# Altium footprint library Intelliclone.PcbLib: 372 footprints (part 12 of 24)
Each footprint in its own frame and in the unit in brackets; x right, y up, seen from the top. Pads: shape width x height; smd on the part's side, far side on the other; paste and mask are expansions set on the pad; w line width, h text height; cw(c..) or ccw(c..) is an arc to the next point about the centre after c.
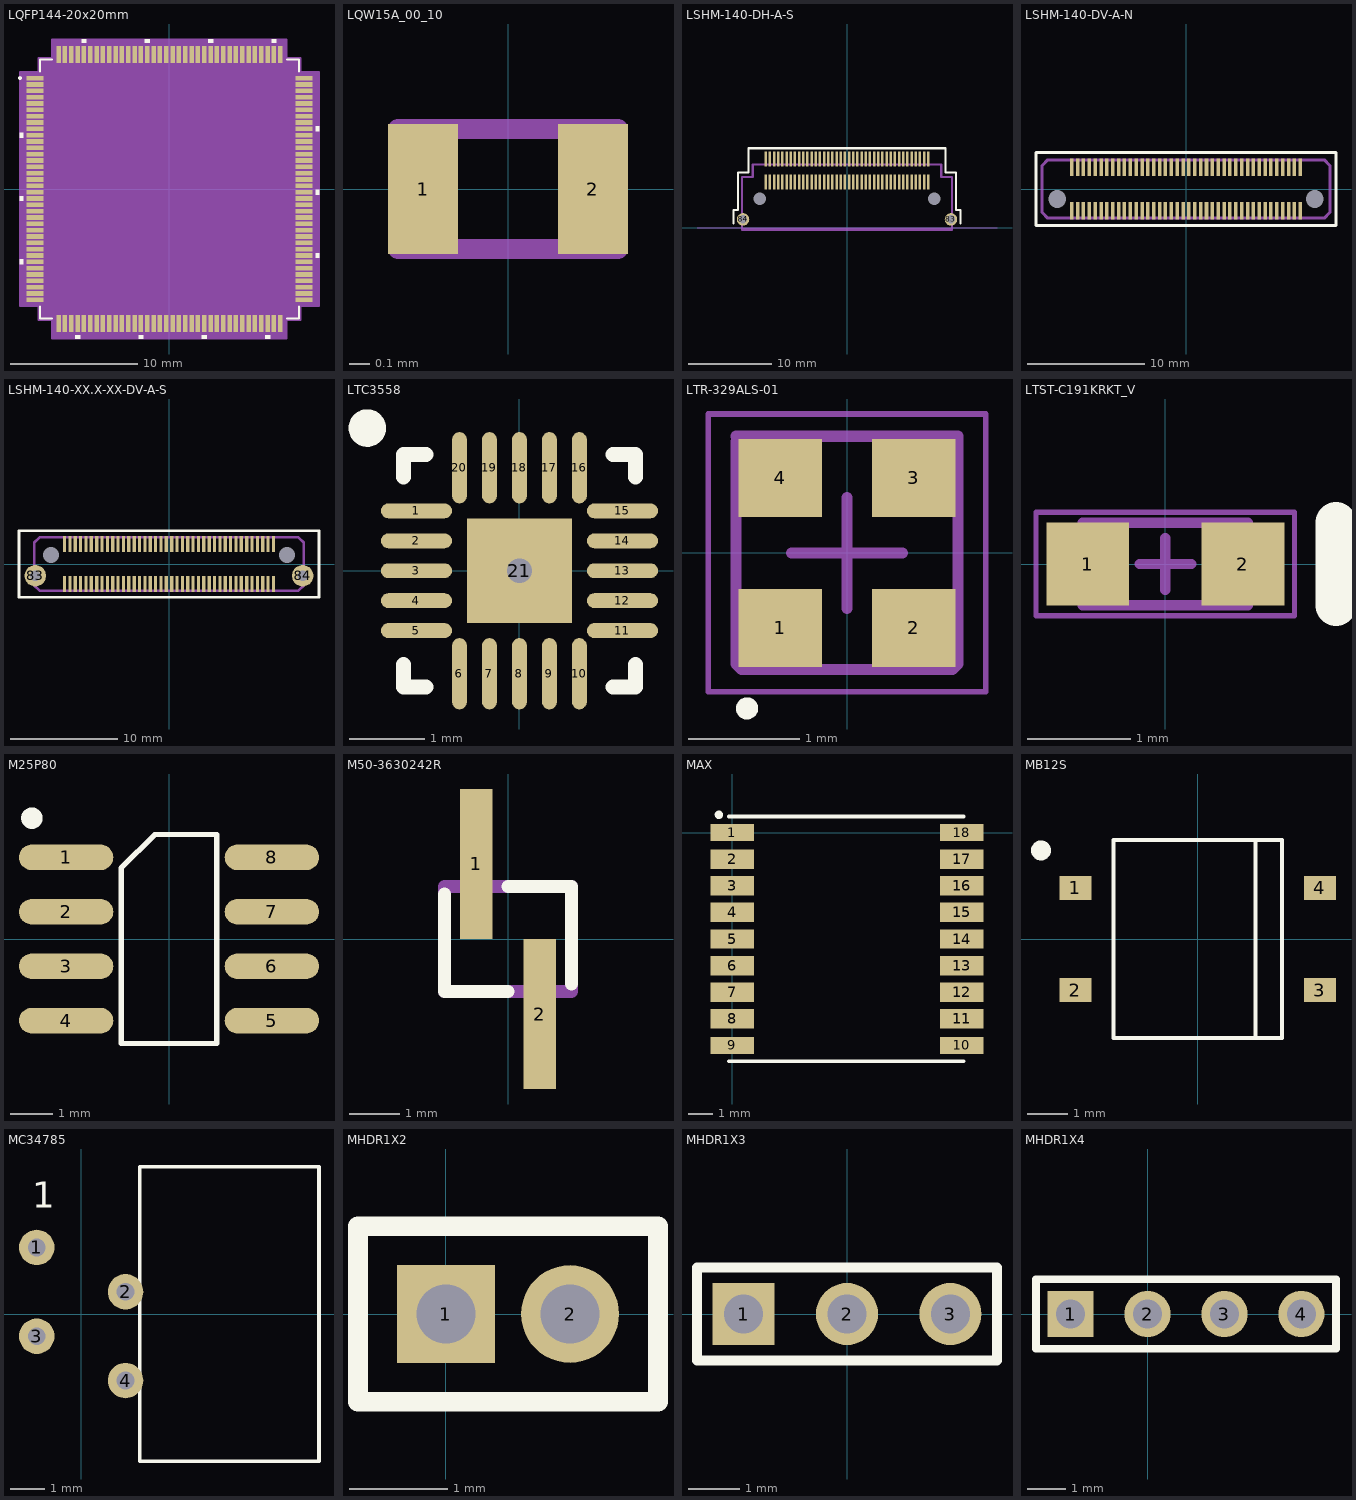
[diagram p11: the footprints below, top view; thin cyan lines are the x and y axes]

## LQFP144-20x20mm [mm]
pads (144):
  rect 1.346x0.356 smd: 1(-10.625,8.75) 2(-10.625,8.25) 3(-10.625,7.75) 4(-10.625,7.25) 5(-10.625,6.75) 6(-10.625,6.25) 7(-10.625,5.75) 8(-10.625,5.25) 9(-10.625,4.75) 10(-10.625,4.25) 11(-10.625,3.75) 12(-10.625,3.25) 13(-10.625,2.75) 14(-10.625,2.25) 15(-10.625,1.75) 16(-10.625,1.25) 17(-10.625,0.75) 18(-10.625,0.25) 19(-10.625,-0.25) 20(-10.625,-0.75) 21(-10.625,-1.25) 22(-10.625,-1.75) 23(-10.625,-2.25) 24(-10.625,-2.75) 25(-10.625,-3.25) 26(-10.625,-3.75) 27(-10.625,-4.25) 28(-10.625,-4.75) 29(-10.625,-5.25) 30(-10.625,-5.75) 31(-10.625,-6.25) 32(-10.625,-6.75) 33(-10.625,-7.25) 34(-10.625,-7.75) 35(-10.625,-8.25) 36(-10.625,-8.75) 73(10.625,-8.75) 74(10.625,-8.25) 75(10.625,-7.75) 76(10.625,-7.25) 77(10.625,-6.75) 78(10.625,-6.25) 79(10.625,-5.75) 80(10.625,-5.25) 81(10.625,-4.75) 82(10.625,-4.25) 83(10.625,-3.75) 84(10.625,-3.25) 85(10.625,-2.75) 86(10.625,-2.25) 87(10.625,-1.75) 88(10.625,-1.25) 89(10.625,-0.75) 90(10.625,-0.25) 91(10.625,0.25) 92(10.625,0.75) 93(10.625,1.25) 94(10.625,1.75) 95(10.625,2.25) 96(10.625,2.75) 97(10.625,3.25) 98(10.625,3.75) 99(10.625,4.25) 100(10.625,4.75) 101(10.625,5.25) 102(10.625,5.75) 103(10.625,6.25) 104(10.625,6.75) 105(10.625,7.25) 106(10.625,7.75) 107(10.625,8.25) 108(10.625,8.75)
  rect 0.356x1.346 smd: 37(-8.75,-10.625) 38(-8.25,-10.625) 39(-7.75,-10.625) 40(-7.25,-10.625) 41(-6.75,-10.625) 42(-6.25,-10.625) 43(-5.75,-10.625) 44(-5.25,-10.625) 45(-4.75,-10.625) 46(-4.25,-10.625) 47(-3.75,-10.625) 48(-3.25,-10.625) 49(-2.75,-10.625) 50(-2.25,-10.625) 51(-1.75,-10.625) 52(-1.25,-10.625) 53(-0.75,-10.625) 54(-0.25,-10.625) 55(0.25,-10.625) 56(0.75,-10.625) 57(1.25,-10.625) 58(1.75,-10.625) 59(2.25,-10.625) 60(2.75,-10.625) 61(3.25,-10.625) 62(3.75,-10.625) 63(4.25,-10.625) 64(4.75,-10.625) 65(5.25,-10.625) 66(5.75,-10.625) 67(6.25,-10.625) 68(6.75,-10.625) 69(7.25,-10.625) 70(7.75,-10.625) 71(8.25,-10.625) 72(8.75,-10.625) 109(8.75,10.625) 110(8.25,10.625) 111(7.75,10.625) 112(7.25,10.625) 113(6.75,10.625) 114(6.25,10.625) 115(5.75,10.625) 116(5.25,10.625) 117(4.75,10.625) 118(4.25,10.625) 119(3.75,10.625) 120(3.25,10.625) 121(2.75,10.625) 122(2.25,10.625) 123(1.75,10.625) 124(1.25,10.625) 125(0.75,10.625) 126(0.25,10.625) 127(-0.25,10.625) 128(-0.75,10.625) 129(-1.25,10.625) 130(-1.75,10.625) 131(-2.25,10.625) 132(-2.75,10.625) 133(-3.25,10.625) 134(-3.75,10.625) 135(-4.25,10.625) 136(-4.75,10.625) 137(-5.25,10.625) 138(-5.75,10.625) 139(-6.25,10.625) 140(-6.75,10.625) 141(-7.25,10.625) 142(-7.75,10.625) 143(-8.25,10.625) 144(-8.75,10.625)
Top Overlay:
  circle w0.152: c-11.802,8.75 r0.076
  region: -11.552,4.44 -11.806,4.44 -11.806,4.059 -11.552,4.059
  region: -11.552,-0.56 -11.806,-0.56 -11.806,-0.941 -11.552,-0.941
  region: -11.552,-5.56 -11.806,-5.56 -11.806,-5.941 -11.552,-5.941
  region: -7.06,-11.552 -7.441,-11.552 -7.441,-11.806 -7.06,-11.806
  region: -2.06,-11.552 -2.441,-11.552 -2.441,-11.806 -2.06,-11.806
  region: 2.94,-11.552 2.559,-11.552 2.559,-11.806 2.94,-11.806
  region: 7.94,-11.552 7.559,-11.552 7.559,-11.806 7.94,-11.806
  region: 11.552,-5.059 11.806,-5.059 11.806,-5.44 11.552,-5.44
  region: 11.552,-0.059 11.806,-0.059 11.806,-0.44 11.552,-0.44
  region: 11.552,4.941 11.806,4.941 11.806,4.56 11.552,4.56
  region: 8.441,11.552 8.06,11.552 8.06,11.806 8.441,11.806
  region: 3.441,11.552 3.06,11.552 3.06,11.806 3.441,11.806
  region: -1.559,11.552 -1.94,11.552 -1.94,11.806 -1.559,11.806
  region: -6.559,11.552 -6.94,11.552 -6.94,11.806 -6.559,11.806
  lines w0.152: -10.223,-9.261 -10.223,-10.223 -9.261,-10.223 ; -10.223,9.261 -10.223,10.223 -9.261,10.223 ; 9.261,-10.223 10.223,-10.223 10.223,-9.261 ; 9.261,10.223 10.223,10.223 10.223,9.261
Mechanical 13:
  circle w0: c-9.317,8.75 r0.076
  lines w0.025: -10.096,8.826 -8.826,10.096 ; -10.096,-10.096 10.096,-10.096 10.096,10.096 -10.096,10.096 -10.096,-10.096
Mechanical 15:
  region: -9.258,-10.351 -10.351,-10.351 -10.351,-9.258 -11.806,-9.258 -11.806,9.258 -10.351,9.258 -10.351,10.351 -9.258,10.351 -9.258,11.806 9.258,11.806 9.258,10.351 10.351,10.351 10.351,9.258 11.806,9.258 11.806,-9.258 10.351,-9.258 10.351,-10.351 9.258,-10.351 9.258,-11.806 -9.258,-11.806
  lines w0.152: -11.806,-9.258 -10.351,-9.258 -10.351,-10.351 -9.258,-10.351 -9.258,-11.806 9.258,-11.806 9.258,-10.351 10.351,-10.351 10.351,-9.258 11.806,-9.258 11.806,9.258 10.351,9.258 10.351,10.351 9.258,10.351 9.258,11.806 -9.258,11.806 -9.258,10.351 -10.351,10.351 -10.351,9.258 -11.806,9.258 -11.806,-9.258
3D body: height 0.25, standoff 0, extent 0,0 0.254,0.254
3D body: height 1.6, standoff 0, extent 0,0 0,0
3D body: height 1.6, standoff 0, extent 0,0 0,0
3D body "LQFP144-20x20mm.step": height 1.6, standoff 0, extent -10.948,-10.948 10.948,10.948

## LQW15A_00_10 [mm] "Murata"
height 0.6
pads (2):
  rect 0.35x0.65 smd: 1(-0.425,0) 2(0.425,0)
Mechanical 5:
  lines w0.1: -0.55,-0.3 -0.55,0.3 0.55,0.3 0.55,-0.3 -0.55,-0.3
  text ".Designator" at -0.457,0.508 h0.25
3D body: height 0.6, standoff 0.15, extent -0.249,-0.349 0.249,0.349
3D body: height 0.6, standoff 0, extent -0.55,-0.3 -0.25,0.3
3D body: height 0.6, standoff 0, extent 0.25,-0.3 0.55,0.3

## LSHM-140-DH-A-S [mm]
pads (84):
  rect 0.3x1.8 smd mask+0.05: 1(9.75,8.27) 2(9.75,5.52) 3(9.25,8.27) 4(9.25,5.52) 5(8.75,8.27) 6(8.75,5.52) 7(8.25,8.27) 8(8.25,5.52) 9(7.75,8.27) 10(7.75,5.52) 11(7.25,8.27) 12(7.25,5.52) 13(6.75,8.27) 14(6.75,5.52) 15(6.25,8.27) 16(6.25,5.52) 17(5.75,8.27) 18(5.75,5.52) 19(5.25,8.27) 20(5.25,5.52) 21(4.75,8.27) 22(4.75,5.52) 23(4.25,8.27) 24(4.25,5.52) 25(3.75,8.27) 26(3.75,5.52) 27(3.25,8.27) 28(3.25,5.52) 29(2.75,8.27) 30(2.75,5.52) 31(2.25,8.27) 32(2.25,5.52) 33(1.75,8.27) 34(1.75,5.52) 35(1.25,8.27) 36(1.25,5.52) 37(0.75,8.27) 38(0.75,5.52) 39(0.25,8.27) 40(0.25,5.52) 41(-0.25,8.27) 42(-0.25,5.52) 43(-0.75,8.27) 44(-0.75,5.52) 45(-1.25,8.27) 46(-1.25,5.52) 47(-1.75,8.27) 48(-1.75,5.52) 49(-2.25,8.27) 50(-2.25,5.52) 51(-2.75,8.27) 52(-2.75,5.52) 53(-3.25,8.27) 54(-3.25,5.52) 55(-3.75,8.27) 56(-3.75,5.52) 57(-4.25,8.27) 58(-4.25,5.52) 59(-4.75,8.27) 60(-4.75,5.52) 61(-5.25,8.27) 62(-5.25,5.52) 63(-5.75,8.27) 64(-5.75,5.52) 65(-6.25,8.27) 66(-6.25,5.52) 67(-6.75,8.27) 68(-6.75,5.52) 69(-7.25,8.27) 70(-7.25,5.52) 71(-7.75,8.27) 72(-7.75,5.52) 73(-8.25,8.27) 74(-8.25,5.52) 75(-8.75,8.27) 76(-8.75,5.52) 77(-9.25,8.27) 78(-9.25,5.52) 79(-9.75,8.27) 80(-9.75,5.52)
  round 0 hole 1.5 unplated: 81(10.5,3.47) 82(-10.5,3.47)
  round 1.5 hole 1 mask+0.075: 83(12.475,1.02) 84(-12.475,1.02)
Top Overlay:
  lines w0.25: -13.6,0.5 -13.6,2.15 -13.1,2.15 -13.1,6.62 -11.8,6.62 -11.8,9.55 11.8,9.55 11.8,6.62 13.1,6.62 13.1,2.15 13.6,2.15 13.6,0.5
Mechanical 1:
  lines w0.25: -12.6,-0.23 -12.6,6.12 -11.31,6.12 -11.31,7.62 11.31,7.62 11.31,6.12 12.6,6.12 12.6,-0.23 -12.6,-0.23
  text "J1" at -0.439,2.07 h0.75
Mechanical 21:
  lines w0.1: -18,0 18,0
3D body "LSHM-140-01-L-DH-A-S-K-TR.stp": height 5.32, standoff -1.15, extent -12.923,-0.169 12.923,8.781

## LSHM-140-DV-A-N [mm]
pads (82):
  rect 0.3x1.5 smd mask+0.05: 1(9.75,-1.85) 2(9.75,1.85) 3(9.25,-1.85) 4(9.25,1.85) 5(8.75,-1.85) 6(8.75,1.85) 7(8.25,-1.85) 8(8.25,1.85) 9(7.75,-1.85) 10(7.75,1.85) 11(7.25,-1.85) 12(7.25,1.85) 13(6.75,-1.85) 14(6.75,1.85) 15(6.25,-1.85) 16(6.25,1.85) 17(5.75,-1.85) 18(5.75,1.85) 19(5.25,-1.85) 20(5.25,1.85) 21(4.75,-1.85) 22(4.75,1.85) 23(4.25,-1.85) 24(4.25,1.85) 25(3.75,-1.85) 26(3.75,1.85) 27(3.25,-1.85) 28(3.25,1.85) 29(2.75,-1.85) 30(2.75,1.85) 31(2.25,-1.85) 32(2.25,1.85) 33(1.75,-1.85) 34(1.75,1.85) 35(1.25,-1.85) 36(1.25,1.85) 37(0.75,-1.85) 38(0.75,1.85) 39(0.25,-1.85) 40(0.25,1.85) 41(-0.25,-1.85) 42(-0.25,1.85) 43(-0.75,-1.85) 44(-0.75,1.85) 45(-1.25,-1.85) 46(-1.25,1.85) 47(-1.75,-1.85) 48(-1.75,1.85) 49(-2.25,-1.85) 50(-2.25,1.85) 51(-2.75,-1.85) 52(-2.75,1.85) 53(-3.25,-1.85) 54(-3.25,1.85) 55(-3.75,-1.85) 56(-3.75,1.85) 57(-4.25,-1.85) 58(-4.25,1.85) 59(-4.75,-1.85) 60(-4.75,1.85) 61(-5.25,-1.85) 62(-5.25,1.85) 63(-5.75,-1.85) 64(-5.75,1.85) 65(-6.25,-1.85) 66(-6.25,1.85) 67(-6.75,-1.85) 68(-6.75,1.85) 69(-7.25,-1.85) 70(-7.25,1.85) 71(-7.75,-1.85) 72(-7.75,1.85) 73(-8.25,-1.85) 74(-8.25,1.85) 75(-8.75,-1.85) 76(-8.75,1.85) 77(-9.25,-1.85) 78(-9.25,1.85) 79(-9.75,-1.85) 80(-9.75,1.85)
  round 0.5 hole 1.5 unplated mask+0.75: 81(11,-0.85) 82(-11,-0.85)
Top Overlay:
  lines w0.25: -12.8,-3.1 -12.8,3.1 12.8,3.1 12.8,-3.1 -12.8,-3.1
Mechanical 1:
  lines w0.25: -12.3,-1.99 -12.3,1.99 -11.8,2.49 11.8,2.49 12.3,1.99 12.3,-1.99 11.8,-2.49 -11.8,-2.49 -12.3,-1.99
  text "J1" at -0.439,-0.45 h0.75
3D body "LSHM-140-04.0-L-DV-A-S-K-TR.stp": height 5.45, standoff -1.8, extent -12.923,-2.49 12.923,2.49

## LSHM-140-XX.X-XX-DV-A-S [mm]
pads (84):
  rect 0.3x1.5 smd mask+0.05: 1(-9.75,1.85) 2(-9.75,-1.85) 3(-9.25,1.85) 4(-9.25,-1.85) 5(-8.75,1.85) 6(-8.75,-1.85) 7(-8.25,1.85) 8(-8.25,-1.85) 9(-7.75,1.85) 10(-7.75,-1.85) 11(-7.25,1.85) 12(-7.25,-1.85) 13(-6.75,1.85) 14(-6.75,-1.85) 15(-6.25,1.85) 16(-6.25,-1.85) 17(-5.75,1.85) 18(-5.75,-1.85) 19(-5.25,1.85) 20(-5.25,-1.85) 21(-4.75,1.85) 22(-4.75,-1.85) 23(-4.25,1.85) 24(-4.25,-1.85) 25(-3.75,1.85) 26(-3.75,-1.85) 27(-3.25,1.85) 28(-3.25,-1.85) 29(-2.75,1.85) 30(-2.75,-1.85) 31(-2.25,1.85) 32(-2.25,-1.85) 33(-1.75,1.85) 34(-1.75,-1.85) 35(-1.25,1.85) 36(-1.25,-1.85) 37(-0.75,1.85) 38(-0.75,-1.85) 39(-0.25,1.85) 40(-0.25,-1.85) 41(0.25,1.85) 42(0.25,-1.85) 43(0.75,1.85) 44(0.75,-1.85) 45(1.25,1.85) 46(1.25,-1.85) 47(1.75,1.85) 48(1.75,-1.85) 49(2.25,1.85) 50(2.25,-1.85) 51(2.75,1.85) 52(2.75,-1.85) 53(3.25,1.85) 54(3.25,-1.85) 55(3.75,1.85) 56(3.75,-1.85) 57(4.25,1.85) 58(4.25,-1.85) 59(4.75,1.85) 60(4.75,-1.85) 61(5.25,1.85) 62(5.25,-1.85) 63(5.75,1.85) 64(5.75,-1.85) 65(6.25,1.85) 66(6.25,-1.85) 67(6.75,1.85) 68(6.75,-1.85) 69(7.25,1.85) 70(7.25,-1.85) 71(7.75,1.85) 72(7.75,-1.85) 73(8.25,1.85) 74(8.25,-1.85) 75(8.75,1.85) 76(8.75,-1.85) 77(9.25,1.85) 78(9.25,-1.85) 79(9.75,1.85) 80(9.75,-1.85)
  round 0.5 hole 1.5 unplated mask+0.75: 81(-11,0.85) 82(11,0.85)
  round 2 hole 1 mask+0.075: 83(-12.475,-1.1) 84(12.475,-1.1)
Top Overlay:
  lines w0.25: -14,-3.1 14,-3.1 14,3.1 -14,3.1 -14,-3.1
Mechanical 1:
  lines w0.25: -12.575,-1.99 -12.075,-2.49 12.075,-2.49 12.575,-1.99 12.575,1.99 12.075,2.49 -12.075,2.49 -12.575,1.99 -12.575,-1.99
  text "J1" at -0.25,-0.25 h0.75
3D body "LSHM-140-04.0-L-DV-A-S-K-TR.stp": height 5.45, standoff -1.8, extent -12.923,-2.49 12.923,2.49

## LTC3558 [mm]
pads (21):
  oval 0.95x0.2 smd: 1(-1.375,0.8) 2(-1.375,0.4) 3(-1.375,0) 4(-1.375,-0.4) 5(-1.375,-0.8) 11(1.375,-0.8) 12(1.375,-0.4) 13(1.375,0) 14(1.375,0.4) 15(1.375,0.8)
  oval 0.2x0.95 smd: 6(-0.8,-1.375) 7(-0.4,-1.375) 8(0,-1.375) 9(0.4,-1.375) 10(0.8,-1.375) 16(0.8,1.375) 17(0.4,1.375) 18(0,1.375) 19(-0.4,1.375) 20(-0.8,1.375)
  rect 1.4x1.4 smd: 21(0,0)
via 0,0 diameter 0.66 hole 0.33
Top Overlay:
  circle w0.25: c-2.03,1.905 r0.125
  lines w0.2: -1.55,-1.25 -1.55,-1.55 -1.25,-1.55 ; -1.55,1.25 -1.55,1.55 -1.25,1.55 ; 1.25,-1.55 1.55,-1.55 1.55,-1.25 ; 1.25,1.55 1.55,1.55 1.55,1.25
3D body: height 0.8, standoff 0.05, extent -1.55,-1.55 1.55,1.55

## LTR-329ALS-01 [mm] "Optical Sensor"
height 0.7
pads (4):
  rect 0.75x0.7 smd: 1(-0.6,-0.675) 2(0.6,-0.675) 3(0.6,0.675) 4(-0.6,0.675)
Top Overlay:
  circle w0.1: c-0.9,-1.4 r0.05
Mechanical 13:
  lines w0.1: -1,1 -1,-1 -0.95,-1.05 0.95,-1.05 1,-1 1,1.05 -1,1.05
Mechanical 15:
  lines w0.05: -1.25,-1.25 -1.25,1.25 1.25,1.25 1.25,-1.25 -1.25,-1.25
  lines w0.1: -0.5,0 0.5,0 ; 0,-0.5 0,0.5
3D body "LTR-329ALS-simple.step": height 0.61, standoff 0, extent -1,-1 1,1

## LTST-C191KRKT_V [mm] "SMD, 2-Leads, Body 1.6x0.8mm"
height 0.9
pads (2):
  rect 0.8x0.8 smd: 1(-0.75,0) 2(0.75,0)
Top Overlay:
  lines w0.4: 1.65,-0.4 1.65,0.4
Mechanical 13:
  lines w0.1: -0.55,-0.4 -0.55,0.4 ; 0.55,-0.4 0.55,0.4 ; -0.8,-0.4 -0.8,0.4 0.8,0.4 0.8,-0.4 -0.8,-0.4
Mechanical 15:
  lines w0.05: -1.25,-0.5 1.25,-0.5 1.25,0.5 -1.25,0.5 -1.25,-0.5
  lines w0.1: -0.25,0 0.25,0 ; 0,-0.25 0,0.25
3D body: height 0.9, standoff 0.38, extent -0.55,-0.4 0.55,0.4
3D body: height 0.38, standoff 0, extent -0.8,-0.4 0.8,0.4

## M25P80 [mm]
height 2.54
pads (8):
  oval 2.2x0.6 smd: 1(-2.4,1.905) 2(-2.4,0.635) 3(-2.4,-0.635) 4(-2.4,-1.905) 5(2.4,-1.905) 6(2.4,-0.635) 7(2.4,0.635) 8(2.4,1.905)
Top Overlay:
  lines w0.127: -1.118,-2.438 -1.118,1.651 -0.33,2.438 1.118,2.438 1.118,-2.438 -1.118,-2.438
  lines w0.25: -3.075,2.836 ccw(c-3.198,2.819) -3.073,2.819
3D body: height 1.02, standoff 0.1, extent -1.956,-2.438 1.956,2.438

## M50-3630242R [mm]
pads (2):
  rect 0.65x3 smd: 1(-0.635,1.5) 2(0.635,-1.5)
Top Overlay:
  lines w0.254: -1.27,0.9 -1.27,-1.05 0,-1.05 ; 0,1.05 1.27,1.05 1.27,-0.9
Mechanical 15:
  lines w0.254: -1.27,-1.05 -1.27,1.05 1.27,1.05 1.27,-1.05 -1.27,-1.05
3D body "M50-3630242.STEP": height 4.47, standoff -0.03, extent -1.272,-2.373 1.27,2.627

## MAX [mm] "u-blox MAX GPS/GNSS module"
height 2.7
pads (18):
  rect 1.8x0.7 smd paste-0.1: 1(0,0) 9(0,-8.8) 10(9.5,-8.8) 18(9.5,0)
  rect 1.8x0.8 smd paste-0.1: 2(0,-1.1) 3(0,-2.2) 4(0,-3.3) 5(0,-4.4) 6(0,-5.5) 7(0,-6.6) 8(0,-7.7) 11(9.5,-7.7) 12(9.5,-6.6) 13(9.5,-5.5) 14(9.5,-4.4) 15(9.5,-3.3) 16(9.5,-2.2) 17(9.5,-1.1)
Top Overlay:
  lines w0.16: -0.127,-9.455 9.576,-9.455 ; -0.12,0.667 9.576,0.667
  lines w0.2: -0.619,0.74 cw(c-0.545,0.733) -0.616,0.712
Top Paste:
  region: -1.45,-7.3 -1.45,-8.1 -0.05,-8.1 -0.05,-8 0.85,-8 0.85,-7.4 -0.05,-7.4 -0.05,-7.3
  region: -1.45,-6.2 -1.45,-7 -0.05,-7 -0.05,-6.9 0.85,-6.9 0.85,-6.3 -0.05,-6.3 -0.05,-6.2
  region: -1.45,-5.1 -1.45,-5.9 -0.05,-5.9 -0.05,-5.8 0.85,-5.8 0.85,-5.2 -0.05,-5.2 -0.05,-5.1
  region: -1.45,-4 -1.45,-4.8 -0.05,-4.8 -0.05,-4.7 0.85,-4.7 0.85,-4.1 -0.05,-4.1 -0.05,-4
  region: -1.45,-2.9 -1.45,-3.7 -0.05,-3.7 -0.05,-3.6 0.85,-3.6 0.85,-3 -0.05,-3 -0.05,-2.9
  region: -1.45,-1.8 -1.45,-2.6 -0.05,-2.6 -0.05,-2.5 0.85,-2.5 0.85,-1.9 -0.05,-1.9 -0.05,-1.8
  region: -1.45,-0.7 -1.45,-1.5 -0.05,-1.5 -0.05,-1.4 0.85,-1.4 0.85,-0.8 -0.05,-0.8 -0.05,-0.7
  region: 10.95,-1.5 10.95,-0.7 9.55,-0.7 9.55,-0.8 8.65,-0.8 8.65,-1.4 9.55,-1.4 9.55,-1.5
  region: 10.95,-2.6 10.95,-1.8 9.55,-1.8 9.55,-1.9 8.65,-1.9 8.65,-2.5 9.55,-2.5 9.55,-2.6
  region: 10.95,-3.7 10.95,-2.9 9.55,-2.9 9.55,-3 8.65,-3 8.65,-3.6 9.55,-3.6 9.55,-3.7
  region: 10.95,-4.8 10.95,-4 9.55,-4 9.55,-4.1 8.65,-4.1 8.65,-4.7 9.55,-4.7 9.55,-4.8
  region: 10.95,-5.9 10.95,-5.1 9.55,-5.1 9.55,-5.2 8.65,-5.2 8.65,-5.8 9.55,-5.8 9.55,-5.9
  region: 10.95,-7 10.95,-6.2 9.55,-6.2 9.55,-6.3 8.65,-6.3 8.65,-6.9 9.55,-6.9 9.55,-7
  region: 10.95,-8.1 10.95,-7.3 9.55,-7.3 9.55,-7.4 8.65,-7.4 8.65,-8 9.55,-8 9.55,-8.1
  region: 10.95,-0.35 10.95,0.35 9.55,0.35 9.55,0.25 8.65,0.25 8.65,-0.25 9.55,-0.25 9.55,-0.35
  region: -1.45,0.35 -1.45,-0.35 -0.05,-0.35 -0.05,-0.25 0.85,-0.25 0.85,0.25 -0.05,0.25 -0.05,0.35
  region: -1.45,-8.45 -1.45,-9.15 -0.05,-9.15 -0.05,-9.05 0.85,-9.05 0.85,-8.55 -0.05,-8.55 -0.05,-8.45
  region: 10.95,-9.15 10.95,-8.45 9.55,-8.45 9.55,-8.55 8.65,-8.55 8.65,-9.05 9.55,-9.05 9.55,-9.15
3D body "MAX (STEP-AP214).STEP": height 2.47, standoff 0, extent -0.124,-9.45 9.576,0.65

## MB12S [mm]
pads (4):
  rect 0.8x0.6 smd: 1(-3.05,1.275) 2(-3.05,-1.275) 3(3.05,-1.275) 4(3.05,1.275)
Top Overlay:
  circle w0.25: c-3.91,2.21 r0.125
  lines w0.102: 1.44,-2.475 1.44,2.475 ; -2.1,-2.475 2.1,-2.475 2.1,2.475 -2.1,2.475 -2.1,-2.475
3D body: height 0.69, standoff 0.1, extent -3.226,-1.321 3.251,1.372

## MC34785 [mil] "1.25mm 4 pin FPC header"
height 209.84
pads (4):
  round 40 hole 20: 1(-50,75) 2(50,25) 3(-50,-25) 4(50,-75)
Top Overlay:
  lines w4.02: 66,-166 268,-166 268,166 66,166 66,-166
  text "1" at -55,110 h50
3D body: height 110, standoff 4, extent 66,-166 268,165

## MHDR1X2 [mm] "Connector; Header; 2 Position"
pads (2):
  rect 1x1 hole 0.6: 1(0,0)
  round 1 hole 0.6: 2(1.27,0)
Top Overlay:
  lines w0.2: -0.9,-0.9 2.17,-0.9 2.17,0.9 -0.9,0.9 -0.9,-0.9

## MHDR1X3 [mm] "Connector; Header; 3 Position 2mm"
pads (3):
  rect 1.2x1.2 hole 0.75: 1(-2,0)
  round 1.2 hole 0.75: 2(0,0) 3(2,0)
Top Overlay:
  lines w0.2: -2.9,-0.9 -2.9,0.9 2.9,0.9 2.9,-0.9 -2.9,-0.9

## MHDR1X4 [mm] "Connector; Header; 3 Position 2mm"
pads (4):
  rect 1.2x1.2 hole 0.75: 1(-2,0)
  round 1.2 hole 0.75: 2(0,0) 3(2,0) 4(4,0)
Top Overlay:
  lines w0.2: -2.9,-0.9 -2.9,0.9 4.9,0.9 4.9,-0.9 -2.9,-0.9